# Altium footprint library AD_Connectors.PcbLib: 130 footprints (part 8 of 9)
Each footprint in its own frame and in the unit in brackets; x right, y up, seen from the top. Pads: shape width x height; smd on the part's side, far side on the other; paste and mask are expansions set on the pad; w line width, h text height; cw(c..) or ccw(c..) is an arc to the next point about the centre after c.
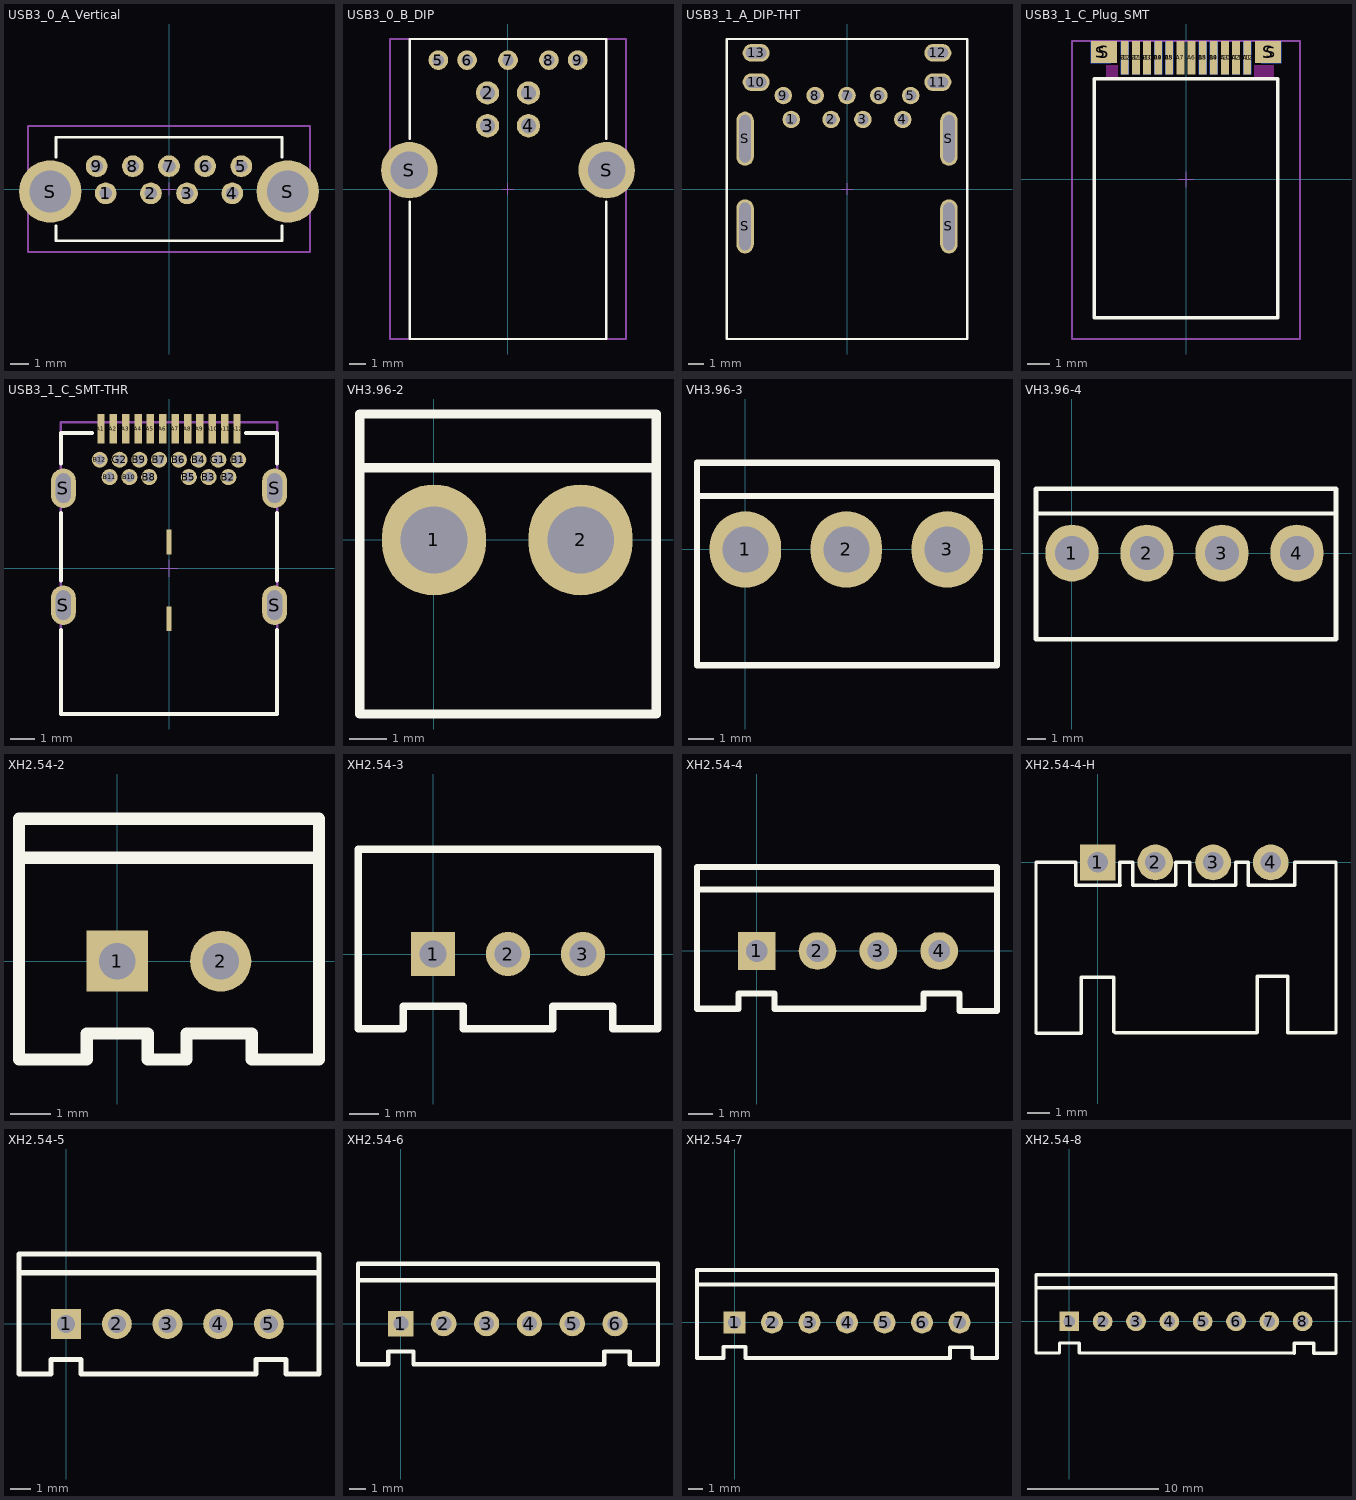
[diagram p7: the footprints below, top view; thin cyan lines are the x and y axes]

## USB3_0_A_Vertical [mm] "USB 3.0 Type A Vertical THT"
height 15
pads (11):
  round 1.2 hole 0.7: 1(-3.5,-0.235) 2(-1,-0.235) 3(1,-0.235) 4(3.5,-0.235) 5(4,1.265) 6(2,1.265) 7(0,1.265) 8(-2,1.265) 9(-4,1.265)
  round 3.45 hole 2.3: S(-6.57,-0.135) S(6.57,-0.135)
Top Overlay:
  lines w0.15: -6.25,-2.035 -6.25,-2.855 6.25,-2.855 6.25,-2.035 ; -6.25,1.765 -6.25,2.865 6.25,2.865 6.25,1.765
Mechanical 13:
  lines w0.1: -7.8,-3.475 7.8,-3.475 7.8,3.485 -7.8,3.485 -7.8,-3.475
Mechanical 15:
  lines w0.05: -0.35,0 0.35,0 ; 0,-0.35 0,0.35
3D body "692121430000.stp": height 15.1, standoff -3.67, extent -7.8,-3.475 7.8,3.475

## USB3_0_B_DIP [mm] "USB 3.0 Type B Horizontal"
height 12.9
pads (11):
  round 1.42 hole 0.92: 1(1.25,5.86) 2(-1.25,5.86) 3(-1.25,3.86) 4(1.25,3.86)
  round 1.2 hole 0.7: 5(-4.25,7.86) 6(-2.5,7.86) 7(0,7.86) 8(2.5,7.86) 9(4.25,7.86)
  round 3.45 hole 2.3: S(-6.02,1.15) S(6.02,1.15)
Top Overlay:
  lines w0.15: -6,-0.78 -6,-9.15 6,-9.15 6,-0.78 ; -6,3.07 -6,9.15 6,9.15 6,3.07
Mechanical 13:
  lines w0.1: -7.2,-9.15 7.2,-9.15 7.2,9.15 -7.2,9.15 -7.2,-9.15
Mechanical 15:
  lines w0.05: -0.35,0 0.35,0 ; 0,-0.35 0,0.35
3D body "692221030100.stp": height 12.95, standoff -3.18, extent -7.2,-9.15 7.2,9.15

## USB3_1_A_DIP-THT [mm] "USB 3.1 Type A Receptacle Horizontal THT Power Delivery"
height 8.01
pads (17):
  round 1.1 hole 0.7: 1(-3.5,4.365) 2(-1,4.365) 3(1,4.365) 4(3.5,4.365) 5(4,5.865) 6(2,5.865) 7(0,5.865) 8(-2,5.865) 9(-4,5.865)
  oval 1.7x1.1 hole 0.7 slot 1.3 at 0 deg: 10(-5.7,6.705) 11(5.7,6.705) 12(5.7,8.545) 13(-5.7,8.545)
  oval 1.1x3.4 hole 0.7 slot 3 at 90 deg: S(-6.4,-2.345) S(-6.4,3.155) S(6.4,-2.345) S(6.4,3.155)
Top Overlay:
  lines w0.15: -7.55,-9.415 7.55,-9.415 7.55,9.415 -7.55,9.415 -7.55,-9.415
Mechanical 1:
  text "PCB Thickness 1.6mm" at -3.15,-10.15 h0.76
Mechanical 13:
  lines w0.1: -7.55,-9.415 -7.55,9.415 7.55,9.415 7.55,-9.415 -7.55,-9.415
Mechanical 15:
  lines w0.05: -0.35,0 0.35,0 ; 0,-0.35 0,0.35
3D body "632121300001.stp": height 8.01, standoff -1.81, extent -7.55,-9.415 7.55,9.415

## USB3_1_C_Plug_SMT [mm] "USB 3.1 Type C Plug Horizontal SMT"
height 2.4
pads (26):
  rect 0.35x1.5 smd: A1(2.75,5.475) A2(2.25,5.475) A3(1.75,5.475) A4(1.25,5.475) A5(0.75,5.475) A6(0.25,5.475) A7(-0.25,5.475) A8(-0.75,5.475) A9(-1.25,5.475) A10(-1.75,5.475) A11(-2.25,5.475) A12(-2.75,5.475)
  rect 0.35x1.5 smd far side: B1(-2.75,5.475) B2(-2.25,5.475) B3(-1.75,5.475) B4(-1.25,5.475) B5(-0.75,5.475) B8(0.75,5.475) B9(1.25,5.475) B10(1.75,5.475) B11(2.25,5.475) B12(2.75,5.475)
  rect 0.9x1 smd far side: S(-3.825,5.725) S(3.825,5.725)
  rect 1.18x1 smd: S(-3.69,5.725) S(3.69,5.725)
Top Overlay:
  lines w0.15: -4.125,-6.225 -4.125,4.525 4.125,4.525 4.125,-6.225 -4.125,-6.225
Bottom Overlay:
  lines w0.15: -4.125,-6.225 4.125,-6.225 4.125,4.525 -4.125,4.525 -4.125,-6.225
Keep-Out Layer:
  board cut-out: -3.58,4.525 -3.58,5.125 -3.08,5.125 -3.08,4.525
  board cut-out: 3.075,4.525 3.075,5.125 3.945,5.125 3.945,4.525
Mechanical 1:
  text "PCB Thickness 0.8mm" at -3.5,-7.7 h0.76
Mechanical 13:
  lines w0.1: -5.125,-7.175 5.125,-7.175 5.125,6.225 -5.125,6.225 -5.125,-7.175
Mechanical 15:
  lines w0.05: -0.35,0 0.35,0 ; 0,-0.35 0,0.35
3D body "632712000011.stp": height 1.75, standoff -2.45, extent -5.125,-7.175 5.125,6.225

## USB3_1_C_SMT-THR [mm] "USB 3.1 Type C Receptacle Horizontal THR"
height 2.96
pads (32):
  rect 0.3x1.2 smd: A1(-2.75,5.635) A2(-2.25,5.635) A3(-1.75,5.635) A4(-1.25,5.635) A5(-0.75,5.635) A6(-0.25,5.635) A7(0.25,5.635) A8(0.75,5.635) A9(1.25,5.635) A10(1.75,5.635) A11(2.25,5.635) A12(2.75,5.635)
  round 0.65 hole 0.4: B1(2.8,4.385) B2(2.4,3.685) B3(1.6,3.685) B4(1.2,4.385) B5(0.8,3.685) B6(0.4,4.385) B7(-0.4,4.385) B8(-0.8,3.685) B9(-1.2,4.385) B10(-1.6,3.685) B11(-2.4,3.685) B12(-2.8,4.385) G1(2,4.385) G2(-2,4.385)
  oval 1x1.6 hole 0.6 slot 1.2 at 90 deg: S(-4.27,-1.495) S(-4.27,3.235) S(4.27,-1.495) S(4.27,3.235)
  rect 0.2x1 smd: ""(0,-2.045) ""(0,1.055)
Top Overlay:
  lines w0.15: -4.37,-2.485 -4.37,-5.895 4.37,-5.895 4.37,-2.485 ; -4.37,-0.495 -4.37,2.245 ; -4.37,4.225 -4.37,5.465 -3.1,5.465 ; 3.1,5.465 4.37,5.465 4.37,4.225 ; 4.37,-0.495 4.37,2.245
Mechanical 1:
  text "PCB Thickness 1.0mm" at -3.15,-6.65 h0.76
Mechanical 13:
  lines w0.1: -4.37,-5.895 4.37,-5.895 4.37,5.895 -4.37,5.895 -4.37,-5.895
Mechanical 15:
  lines w0.05: -0.35,0 0.35,0 ; 0,-0.35 0,0.35
3D body "632723100011.stp": height 3.05, standoff -1.81, extent -4.37,-5.895 4.37,5.899

## VH3.96-2 [mm]
pads (2):
  oval 2.8x3 hole 1.8: 1(0,0) 2(3.96,0)
Top Overlay:
  lines w0.254: -2,1.945 6,1.945 ; -2,-4.7 6,-4.7 6,3.4 -2,3.4 -2,-4.7
3D body "VH3.96-2.STEP": height 10.9, standoff -3.7, extent -1.93,-4.65 5.93,3.85

## VH3.96-3 [mm]
pads (3):
  oval 2.8x3 hole 1.8: 1(0,0) 2(3.96,0) 3(7.92,0)
Top Overlay:
  lines w0.254: -1.9,2.081 9.87,2.1 ; -1.9,-4.55 9.87,-4.55 9.87,3.4 -1.9,3.4 -1.9,-4.55
3D body "User Library-B3P-VH-BK.STEP": height 10.9, standoff -3.7, extent -1.95,-4.54 9.87,3.96

## VH3.96-4 [mm]
pads (4):
  oval 2.8x3 hole 1.8: 1(0,0) 2(3.96,0) 3(7.92,0) 4(11.88,0)
Top Overlay:
  lines w0.254: -1.9,2.081 13.919,2.107 ; -1.9,-4.55 13.945,-4.55 13.945,3.4 -1.9,3.4 -1.9,-4.55
3D body "User Library-B4P-VH-BK.STEP": height 10.9, standoff -3.7, extent -1.89,-4.6 13.89,3.9

## XH2.54-2 [mm]
pads (2):
  rect 1.5x1.5 hole 0.9: 1(0,0)
  round 1.5 hole 0.9: 2(2.54,0)
Top Overlay:
  lines w0.3: -2.413,-2.413 -0.75,-2.413 -0.75,-1.778 0.75,-1.778 0.75,-2.413 1.7,-2.413 ; 1.7,-2.1 1.7,-2.2 1.7,-2.413 ; 4.953,-2.413 3.3,-2.413 3.3,-1.778 1.7,-1.778 1.7,-2.413
  lines w0.305: -2.413,-2.413 -2.413,3.5 4.953,3.5 4.953,-2.413 ; -2.413,2.54 4.953,2.54
3D body "User Library-B2B-XH-A.STEP": height 7.1, standoff -3.3, extent -2.43,-2.35 4.97,3.4

## XH2.54-3 [mm]
pads (3):
  rect 1.5x1.5 hole 0.9: 1(0,0)
  round 1.5 hole 0.9: 2(2.54,0) 3(5.08,0)
Top Overlay:
  lines w0.254: -2.54,-2.54 -1.016,-2.54 -1.016,-1.778 1.016,-1.778 1.016,-2.54 4.064,-2.54 4.064,-1.778 6.096,-1.778 6.096,-2.54 7.62,-2.54 7.62,3.556 -2.54,3.556 -2.54,-2.54
3D body "hx254-3tl_y.stp": height 7, standoff -3, extent -2.434,-2.517 7.566,3.483

## XH2.54-4 [mil]
pads (4):
  rect 62x62 hole 35.43: 1(0,0)
  round 62 hole 35.43: 2(100,0) 3(200,0) 4(300,0)
Top Overlay:
  lines w10: -94,101 395,101 ; -98,-95 -98,137.79 395,137.79 395,-98.42 333.46,-98.42 333.46,-70 274.41,-70 274.41,-95 29.53,-95 29.53,-70 -29.53,-70 -29.53,-95 -98,-95
3D body "User Library-B4B-XH-A.STEP": height 279.53, standoff -129.92, extent -94.09,-92.36 394.1,134.02

## XH2.54-4-H [mil]
pads (4):
  rect 62x62 hole 35.43: 1(0,0)
  round 62 hole 35.43: 2(100,0) 3(200,0) 4(300,0)
Top Overlay:
  lines w6.06: 26.14,-199.13 -28.11,-199.13 -28.11,-296.38 -105.91,-296.38 -106.93,-295.35 -106.93,-38.03 -106.93,0 -38.35,0 -38.35,-38.66 -37.8,-39.21 39.21,-39.21 38.66,-38.66 38.66,0 61.18,0 61.18,-39.45 134.65,-39.45 135.2,-38.9 135.2,0 ; 28.19,-199.13 28.19,-293.31 30.24,-295.35 275.91,-295.35 276.93,-294.33 276.93,-198.11 ; 135.67,0 159.21,0 ; 159.76,-39.21 159.76,0 ; 160.55,-39.21 238.82,-39.21 239.06,-38.98 239.06,0 260.55,0 ; 261.1,0 261.1,-39.45 341.97,-39.45 ; 276.93,-197.09 329.13,-197.09 329.61,-197.56 329.61,-294.88 413.07,-294.88 413.07,0 343.54,0 ; 341.97,-38.43 341.97,0
3D body "HDR2.54xV4.STEP": height 236.11, standoff -78.63, extent -105,-300 415,10.75

## XH2.54-5 [mm]
pads (5):
  rect 1.5x1.5 hole 0.9: 1(0,0)
  round 1.5 hole 0.9: 2(2.54,0) 3(5.08,0) 4(7.62,0) 5(10.16,0)
Top Overlay:
  lines w0.254: -2.362,2.565 12.624,2.565 ; 9.523,-2.506 9.523,-1.778 11.023,-1.778 11.023,-2.506 12.669,-2.506 ; 9.523,-2.5 0.75,-2.5 0.75,-1.778 -0.75,-1.778 -0.75,-2.5 -2.362,-2.5 -2.362,3.5 12.675,3.5 12.675,-2.5
3D body "hx254-5tl_y.stp": height 7.51, standoff -2.49, extent -2.358,-2.438 12.722,3.562

## XH2.54-6 [mm]
pads (6):
  rect 1.5x1.5 hole 0.9: 1(0,0)
  round 1.5 hole 0.9: 2(2.54,0) 3(5.08,0) 4(7.62,0) 5(10.16,0) 6(12.7,0)
Top Overlay:
  lines w0.254: -2.362,2.565 15.24,2.565 ; -2.54,-2.413 -0.75,-2.413 -0.75,-1.651 0.75,-1.651 0.75,-2.413 12.063,-2.413 12.063,-1.651 13.563,-1.651 13.563,-2.413 15.24,-2.413 15.24,3.556 -2.54,3.556 -2.54,-2.413
3D body "HDR2.54x6.STEP": height 6.1, standoff -2, extent -2.54,-2.362 15.24,3.632

## XH2.54-7 [mm]
pads (7):
  rect 1.5x1.5 hole 0.9: 1(0,0)
  round 1.5 hole 0.9: 2(2.54,0) 3(5.08,0) 4(7.62,0) 5(10.16,0) 6(12.7,0) 7(15.24,0)
Top Overlay:
  lines w0.254: -2.362,2.565 17.78,2.565 ; -2.54,-2.413 -2.54,3.556 17.78,3.556 17.78,-2.413 16.103,-2.413 16.103,-1.674 14.603,-1.674 14.603,-2.413 0.75,-2.413 0.75,-1.651 -0.75,-1.651 -0.75,-2.413 -2.54,-2.413
3D body "HDR2.54x7.STEP": height 6.1, standoff -2, extent -2.536,-2.362 17.775,3.632

## XH2.54-8 [mm]
pads (8):
  rect 1.5x1.5 hole 0.9: 1(0,0)
  round 1.5 hole 0.9: 2(2.54,0) 3(5.08,0) 4(7.62,0) 5(10.16,0) 6(12.7,0) 7(15.24,0) 8(17.78,0)
Top Overlay:
  lines w0.254: -2.362,2.565 20.32,2.565 ; 17.13,-2.436 17.13,-1.674 18.63,-1.674 18.63,-2.436 20.297,-2.436 ; 17.13,-2.413 0.75,-2.413 0.75,-1.651 -0.75,-1.651 -0.75,-2.413 -2.54,-2.413 -2.54,3.556 20.32,3.556 20.32,-2.413
3D body "HDR2.54x8.STEP": height 6.1, standoff -2, extent -2.54,-2.362 20.32,3.632